# Altium footprint library SMD_Bauteile.PcbLib: 355 footprints (part 3 of 23)
Each footprint in its own frame and in the unit in brackets; x right, y up, seen from the top. Pads: shape width x height; smd on the part's side, far side on the other; paste and mask are expansions set on the pad; w line width, h text height; cw(c..) or ccw(c..) is an arc to the next point about the centre after c.
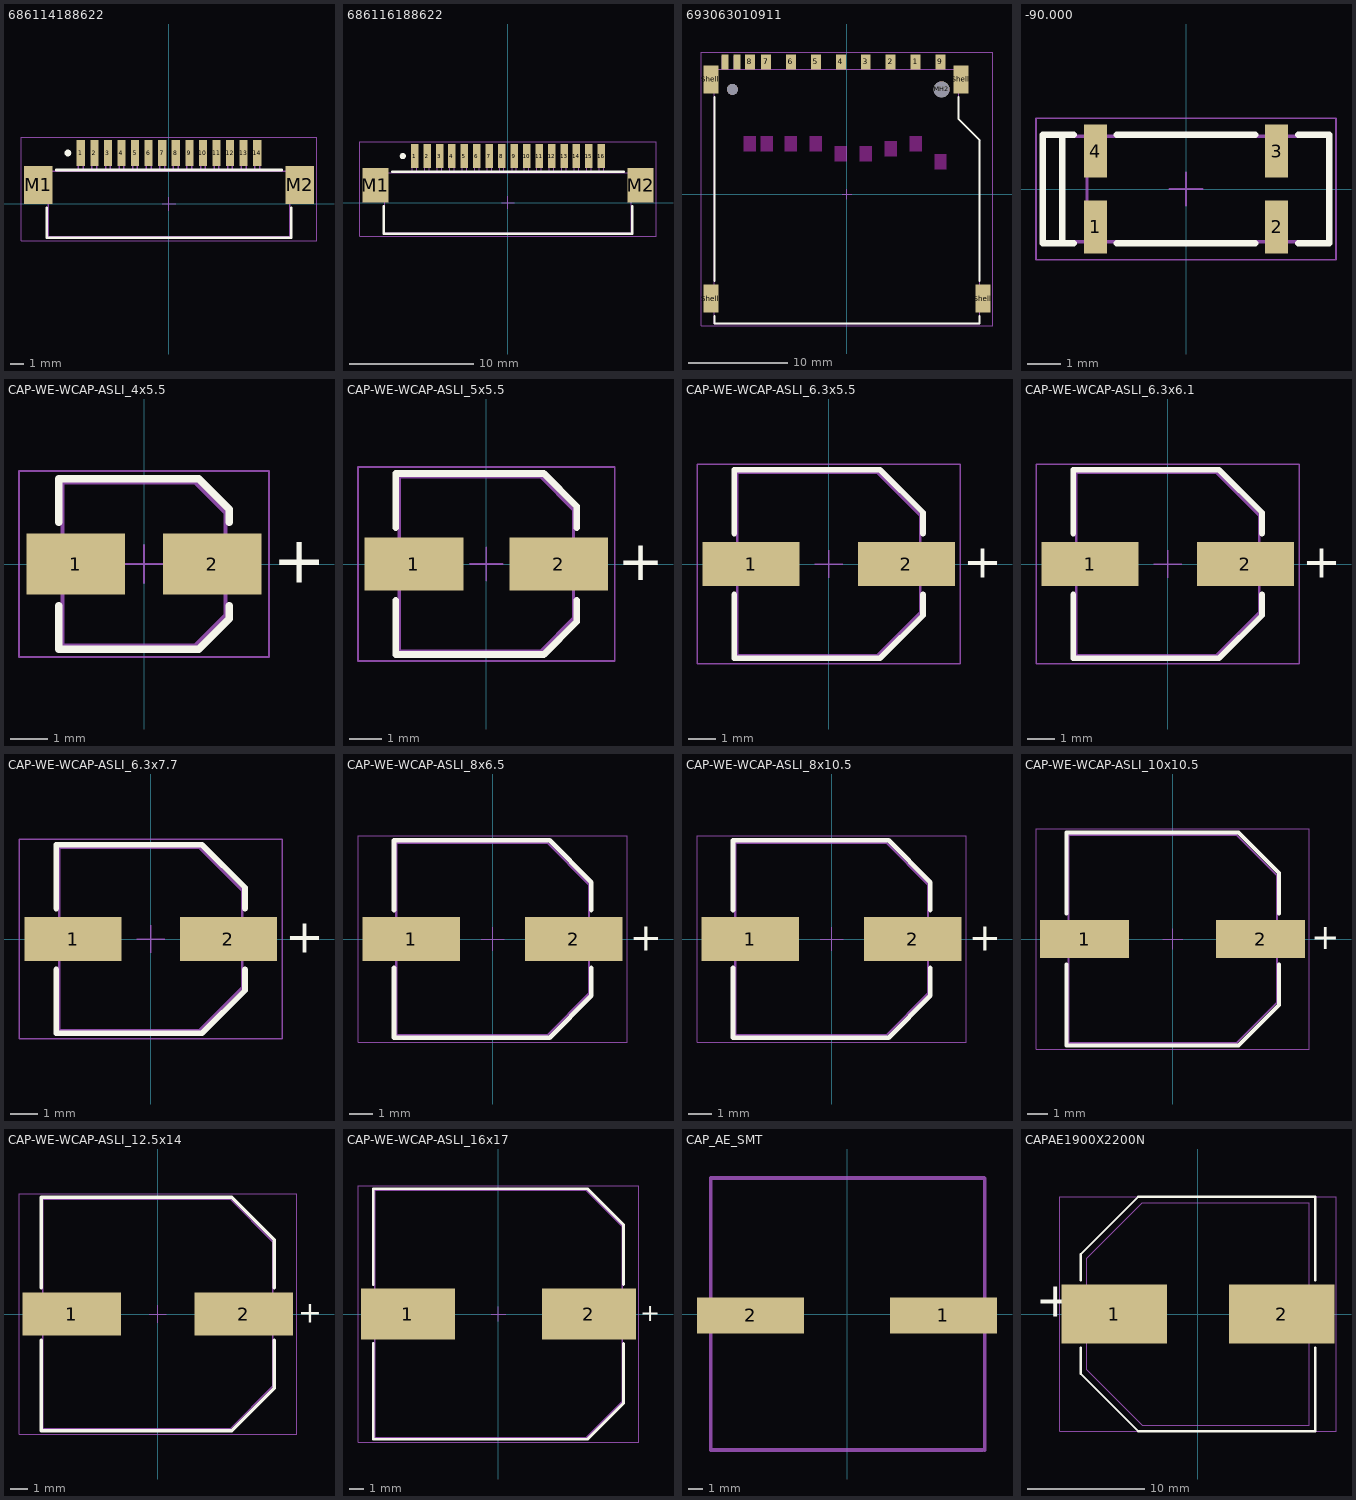
[diagram p2: the footprints below, top view; thin cyan lines are the x and y axes]

## 686114188622 [mm] "LIF Connectors, Horizontal, Top Contact, pitch 1mm, 14p"
height 3.1
pads (16):
  rect 0.6x1.9 smd: 1(-6.5,3.75) 2(-5.5,3.75) 3(-4.5,3.75) 4(-3.5,3.75) 5(-2.5,3.75) 6(-1.5,3.75) 7(-0.5,3.75) 8(0.5,3.75) 9(1.5,3.75) 10(2.5,3.75) 11(3.5,3.75) 12(4.5,3.75) 13(5.5,3.75) 14(6.5,3.75)
  rect 2.1x2.8 smd: M1(-9.65,1.4) M2(9.65,1.4)
Top Overlay:
  circle w0.25: c-7.45,3.75 r0.125
  lines w0.2: -9,-0.3 -9,-2.5 9,-2.5 9,-0.3 ; -8.3,2.5 8.3,2.5
Bottom Designator:
  lines w0.05: -0.5,0 0.5,0 ; 0,-0.5 0,0.5 ; -10.9,-2.7 -10.9,4.9 10.9,4.9 10.9,-2.7 -10.9,-2.7
Top Courtyard (Mech14):
  lines w0.1: -6.675,2.4 -6.675,4.4 -6.325,4.4 -6.325,2.4 ; -5.675,2.4 -5.675,4.4 -5.325,4.4 -5.325,2.4 ; -4.675,2.4 -4.675,4.4 -4.325,4.4 -4.325,2.4 ; -3.675,2.4 -3.675,4.4 -3.325,4.4 -3.325,2.4 ; -2.675,2.4 -2.675,4.4 -2.325,4.4 -2.325,2.4 ; -1.675,2.4 -1.675,4.4 -1.325,4.4 -1.325,2.4 ; -0.675,2.4 -0.675,4.4 -0.325,4.4 -0.325,2.4 ; 0.325,2.4 0.325,4.4 0.675,4.4 0.675,2.4 ; 1.325,2.4 1.325,4.4 1.675,4.4 1.675,2.4 ; 2.325,2.4 2.325,4.4 2.675,4.4 2.675,2.4 ; 3.325,2.4 3.325,4.4 3.675,4.4 3.675,2.4 ; 4.325,2.4 4.325,4.4 4.675,4.4 4.675,2.4 ; 5.325,2.4 5.325,4.4 5.675,4.4 5.675,2.4 ; 6.325,2.4 6.325,4.4 6.675,4.4 6.675,2.4 ; -10.15,0.4 -10.15,2.4 10.15,2.4 10.15,0.4 8.9,0.4 8.9,-2.4 -8.9,-2.4 -8.9,0.4 -10.15,0.4
Mechanical 18:
  lines w0.1: -6.675,2.4 -6.675,4.4 -6.325,4.4 -6.325,2.4 ; -5.675,2.4 -5.675,4.4 -5.325,4.4 -5.325,2.4 ; -4.675,2.4 -4.675,4.4 -4.325,4.4 -4.325,2.4 ; -3.675,2.4 -3.675,4.4 -3.325,4.4 -3.325,2.4 ; -2.675,2.4 -2.675,4.4 -2.325,4.4 -2.325,2.4 ; -1.675,2.4 -1.675,4.4 -1.325,4.4 -1.325,2.4 ; -0.675,2.4 -0.675,4.4 -0.325,4.4 -0.325,2.4 ; 0.325,2.4 0.325,4.4 0.675,4.4 0.675,2.4 ; 1.325,2.4 1.325,4.4 1.675,4.4 1.675,2.4 ; 2.325,2.4 2.325,4.4 2.675,4.4 2.675,2.4 ; 3.325,2.4 3.325,4.4 3.675,4.4 3.675,2.4 ; 4.325,2.4 4.325,4.4 4.675,4.4 4.675,2.4 ; 5.325,2.4 5.325,4.4 5.675,4.4 5.675,2.4 ; 6.325,2.4 6.325,4.4 6.675,4.4 6.675,2.4 ; -10.15,0.4 -8.9,0.4 -8.9,-2.4 8.9,-2.4 8.9,0.4 10.15,0.4 10.15,2.4 -10.15,2.4 -10.15,0.4
Top 3D Body:
  text ".Designator" at -7.498,-0.5 h1.5
3D body "686114188622.stp": height 3.1, standoff -0.01, extent -10.15,-2.4 10.15,4.4

## 686116188622 [mm] "LIF Connectors, Horizontal, Top Contact, pitch 1mm, 16p"
height 3.1
pads (18):
  rect 0.6x1.9 smd: 1(-7.5,3.75) 2(-6.5,3.75) 3(-5.5,3.75) 4(-4.5,3.75) 5(-3.5,3.75) 6(-2.5,3.75) 7(-1.5,3.75) 8(-0.5,3.75) 9(0.5,3.75) 10(1.5,3.75) 11(2.5,3.75) 12(3.5,3.75) 13(4.5,3.75) 14(5.5,3.75) 15(6.5,3.75) 16(7.5,3.75)
  rect 2.1x2.8 smd: M1(-10.65,1.4) M2(10.65,1.4)
Top Overlay:
  circle w0.25: c-8.45,3.75 r0.125
  lines w0.2: -10,-0.3 -10,-2.5 10,-2.5 10,-0.3 ; -9.3,2.5 9.3,2.5
Bottom Designator:
  lines w0.05: -0.5,0 0.5,0 ; 0,-0.5 0,0.5 ; -11.9,-2.7 -11.9,4.9 11.9,4.9 11.9,-2.7 -11.9,-2.7
Top Courtyard (Mech14):
  lines w0.1: -7.675,2.4 -7.675,4.4 -7.325,4.4 -7.325,2.4 ; -6.675,2.4 -6.675,4.4 -6.325,4.4 -6.325,2.4 ; -5.675,2.4 -5.675,4.4 -5.325,4.4 -5.325,2.4 ; -4.675,2.4 -4.675,4.4 -4.325,4.4 -4.325,2.4 ; -3.675,2.4 -3.675,4.4 -3.325,4.4 -3.325,2.4 ; -2.675,2.4 -2.675,4.4 -2.325,4.4 -2.325,2.4 ; -1.675,2.4 -1.675,4.4 -1.325,4.4 -1.325,2.4 ; -0.675,2.4 -0.675,4.4 -0.325,4.4 -0.325,2.4 ; 0.325,2.4 0.325,4.4 0.675,4.4 0.675,2.4 ; 1.325,2.4 1.325,4.4 1.675,4.4 1.675,2.4 ; 2.325,2.4 2.325,4.4 2.675,4.4 2.675,2.4 ; 3.325,2.4 3.325,4.4 3.675,4.4 3.675,2.4 ; 4.325,2.4 4.325,4.4 4.675,4.4 4.675,2.4 ; 5.325,2.4 5.325,4.4 5.675,4.4 5.675,2.4 ; 6.325,2.4 6.325,4.4 6.675,4.4 6.675,2.4 ; 7.325,2.4 7.325,4.4 7.675,4.4 7.675,2.4 ; -11.15,0.4 -11.15,2.4 11.15,2.4 11.15,0.4 9.9,0.4 9.9,-2.4 -9.9,-2.4 -9.9,0.4 -11.15,0.4
Mechanical 18:
  lines w0.1: -7.675,2.4 -7.675,4.4 -7.325,4.4 -7.325,2.4 ; -6.675,2.4 -6.675,4.4 -6.325,4.4 -6.325,2.4 ; -5.675,2.4 -5.675,4.4 -5.325,4.4 -5.325,2.4 ; -4.675,2.4 -4.675,4.4 -4.325,4.4 -4.325,2.4 ; -3.675,2.4 -3.675,4.4 -3.325,4.4 -3.325,2.4 ; -2.675,2.4 -2.675,4.4 -2.325,4.4 -2.325,2.4 ; -1.675,2.4 -1.675,4.4 -1.325,4.4 -1.325,2.4 ; -0.675,2.4 -0.675,4.4 -0.325,4.4 -0.325,2.4 ; 0.325,2.4 0.325,4.4 0.675,4.4 0.675,2.4 ; 1.325,2.4 1.325,4.4 1.675,4.4 1.675,2.4 ; 2.325,2.4 2.325,4.4 2.675,4.4 2.675,2.4 ; 3.325,2.4 3.325,4.4 3.675,4.4 3.675,2.4 ; 4.325,2.4 4.325,4.4 4.675,4.4 4.675,2.4 ; 5.325,2.4 5.325,4.4 5.675,4.4 5.675,2.4 ; 6.325,2.4 6.325,4.4 6.675,4.4 6.675,2.4 ; 7.325,2.4 7.325,4.4 7.675,4.4 7.675,2.4 ; -11.15,0.4 -9.9,0.4 -9.9,-2.4 9.9,-2.4 9.9,0.4 11.15,0.4 11.15,2.4 -11.15,2.4 -11.15,0.4
Top 3D Body:
  text ".Designator" at -7.498,-0.5 h1.5
3D body "686116188622.stp": height 3.1, standoff -0.01, extent -11.15,-2.4 11.15,4.4

## 693063010911 [mm] "SD Card Connector Push & Pull - with Card Detection - 9 Pins"
height 2.6
pads (17):
  rect 1x1.5 smd: 1(6.88,13.3) 2(4.38,13.3) 3(1.88,13.3) 4(-0.62,13.3) 5(-3.12,13.3) 6(-5.62,13.3) 7(-8.12,13.3) 8(-9.75,13.3) 9(9.38,13.3)
  rect 0.7x1.5 smd: 10(-11.05,13.3) 11(-12.25,13.3)
  round 1.1 hole 1.1 unplated: MH1(-11.5,10.55)
  round 1.6 hole 1.6 unplated: MH2(9.5,10.55)
  rect 1.5x2.8 smd: Shell(-13.65,-10.45) Shell(-13.65,11.55) Shell(11.45,11.55) Shell(13.65,-10.45)
Top Layer keep-out:
  region: 8.78,4.05 9.98,4.05 9.98,2.55 8.78,2.55
  region: -10.35,5.85 -9.15,5.85 -9.15,4.35 -10.35,4.35
  region: -8.65,5.85 -7.45,5.85 -7.45,4.35 -8.65,4.35
  region: -6.225,5.85 -5.025,5.85 -5.025,4.35 -6.225,4.35
  region: -3.725,5.85 -2.525,5.85 -2.525,4.35 -3.725,4.35
  region: 6.275,5.85 7.475,5.85 7.475,4.35 6.275,4.35
  region: 3.775,5.35 4.975,5.35 4.975,3.85 3.775,3.85
  region: 1.275,4.85 2.475,4.85 2.475,3.35 1.275,3.35
  region: -1.225,4.85 -0.025,4.85 -0.025,3.35 -1.225,3.35
Top Overlay:
  lines w0.2: -13.3,-12.2 -13.3,-12.95 13.3,-12.95 13.3,-12.2 ; -13.3,-8.7 -13.3,9.8 ; 11.2,9.8 11.2,7.55 13.3,5.45 13.3,-8.7
Bottom Designator:
  lines w0.05: -14.6,-13.15 14.6,-13.15 14.6,14.25 -14.6,14.25 -14.6,-13.15
Bottom 3D Body:
  lines w0.05: -0.5,0 0.5,0 ; 0,-0.5 0,0.5
Top Courtyard (Mech14):
  lines w0.1: -13.3,-11.45 -14,-11.45 -14,-9.45 -13.3,-9.45 ; -13.3,10.55 -14,10.55 -14,12.55 -13.3,12.55 ; -12.525,12.55 -12.525,13.85 -11.975,13.85 -11.975,12.55 ; -11.325,12.55 -11.325,13.85 -10.775,13.85 -10.775,12.55 ; -10.025,12.55 -10.025,13.85 -9.475,13.85 -9.475,12.55 ; -8.395,12.55 -8.395,13.85 -7.845,13.85 -7.845,12.55 ; -5.895,12.55 -5.895,13.85 -5.345,13.85 -5.345,12.55 ; -3.395,12.55 -3.395,13.85 -2.845,13.85 -2.845,12.55 ; -0.895,12.55 -0.895,13.85 -0.345,13.85 -0.345,12.55 ; 1.605,12.55 1.605,13.85 2.155,13.85 2.155,12.55 ; 4.105,12.55 4.105,13.85 4.655,13.85 4.655,12.55 ; 6.605,12.55 6.605,13.85 7.155,13.85 7.155,12.55 ; 9.105,12.55 9.105,13.85 9.655,13.85 9.655,12.55 ; 11.2,10.55 11.9,10.55 11.9,12.55 11.2,12.55 ; 13.3,-11.45 14,-11.45 14,-9.45 13.3,-9.45 ; -13.3,12.55 11.2,12.55 ; -13.3,12.55 -13.3,-12.95 13.3,-12.95 13.3,5.45 11.2,7.55 11.2,12.55
Top 3D Body:
  text ".Designator" at -7.498,-0.5 h1.5
3D body "693063010911.stp": height 3.27, standoff -0.67, extent -14,-12.95 14,13.85

## -90.000 [mm] "Quartz Crystal, size 85SMX, body 8.7x3.2mm"
height 2.5
pads (4):
  rect 0.7x1.6 smd: 1(-2.75,-1.15) 2(2.75,-1.15) 3(2.75,1.15) 4(-2.75,1.15)
Top Overlay:
  lines w0.2: -3.75,-1.6 -3.75,1.6 ; -3.4,-1.65 -4.35,-1.65 -4.35,1.65 -3.4,1.65 ; -2.1,-1.65 2.1,-1.65 ; -2.1,1.65 2.1,1.65 ; 3.4,-1.65 4.35,-1.65 4.35,1.65 3.4,1.65
Dimensions:
  lines w0.1: -3,-1.6 -3,1.6 ; -4.35,-1.6 4.35,-1.6 4.35,1.6 -4.35,1.6 -4.35,-1.6
Mech Misc 1:
  lines w0.1: -4.35,-1.6 -4.35,1.6 4.35,1.6 4.35,-1.6 -4.35,-1.6
Mech 15:
  lines w0.05: -0.5,0 0.5,0 ; 0,-0.5 0,0.5 ; -4.55,-2.15 4.55,-2.15 4.55,2.15 -4.55,2.15 -4.55,-2.15
3D body "FrqXTAL_85SMX.stp": height 2.45, standoff 0, extent -3.9,-1.849 3.9,1.849

## CAP-WE-WCAP-ASLI_4x5.5 [mm] "Aluminium Electrolytic V-Chip SMT Capacitors, 4x5.5mm"
height 5.5
pads (2):
  rect 2.6x1.6 smd: 1(-1.8,0) 2(1.8,0)
Top Overlay:
  lines w0.2: -2.25,-1.1 -2.25,-2.25 1.45,-2.25 2.25,-1.45 2.25,-1.1 ; -2.25,1.1 -2.25,2.25 1.45,2.25 2.25,1.45 2.25,1.1
  text "+" at 3.4,-0.5 h1.22
Mech Misc 1:
  lines w0.1: -2.15,-2.15 1.35,-2.15 2.15,-1.35 2.15,1.35 1.35,2.15 -2.15,2.15 -2.15,-2.15
Mech 15:
  lines w0.05: -0.5,0 0.5,0 ; 0,-0.5 0,0.5 ; -3.3,-2.45 -3.3,2.45 3.3,2.45 3.3,-2.45 -3.3,-2.45
3D body "4x5.5x1.stp": height 5.5, standoff 0, extent -2.5,-2.15 2.5,2.15

## CAP-WE-WCAP-ASLI_5x5.5 [mm] "Aluminium Electrolytic V-Chip SMT Capacitors, 5x5.5mm"
height 5.5
pads (2):
  rect 3x1.6 smd: 1(-2.2,0) 2(2.2,0)
Top Overlay:
  lines w0.2: -2.75,-1.1 -2.75,-2.75 1.75,-2.75 2.75,-1.75 2.75,-1.1 ; -2.75,1.1 -2.75,2.75 1.75,2.75 2.75,1.75 2.75,1.1
  text "+" at 4,-0.5 h1.22
Mech Misc 1:
  lines w0.1: -2.65,-2.65 -2.65,2.65 1.65,2.65 2.65,1.65 2.65,-1.65 1.65,-2.65 -2.65,-2.65
Mech 15:
  lines w0.05: -0.5,0 0.5,0 ; 0,-0.5 0,0.5 ; -3.9,-2.95 3.9,-2.95 3.9,2.95 -3.9,2.95 -3.9,-2.95
3D body "5x5.5x1.4.stp": height 5.5, standoff 0, extent -3,-2.65 3,2.65

## CAP-WE-WCAP-ASLI_6.3x5.5 [mm] "Aluminium Electrolytic V-Chip SMT Capacitors, 6.3x5.5mm"
height 5.5
pads (2):
  rect 3.5x1.6 smd: 1(-2.8,0) 2(2.8,0)
Top Overlay:
  lines w0.2: -3.4,-1.1 -3.4,-3.4 1.85,-3.4 3.4,-1.85 3.4,-1.1 ; -3.4,1.1 -3.4,3.4 1.85,3.4 3.4,1.85 3.4,1.1
  text "+" at 4.85,-0.5 h1.22
Mech Misc 1:
  lines w0.1: -3.3,-3.3 -3.3,3.3 1.75,3.3 3.3,1.75 3.3,-1.75 1.75,-3.3 -3.3,-3.3
Mech 15:
  lines w0.05: -0.5,0 0.5,0 ; 0,-0.5 0,0.5 ; -4.75,-3.6 4.75,-3.6 4.75,3.6 -4.75,3.6 -4.75,-3.6
3D body "6.3x5.5x2.2.stp": height 5.5, standoff 0, extent -3.65,-3.3 3.65,3.3

## CAP-WE-WCAP-ASLI_6.3x6.1 [mm] "Aluminium Electrolytic V-Chip SMT Capacitors, 6.3x6.1mm"
height 6.1
pads (2):
  rect 3.5x1.6 smd: 1(-2.8,0) 2(2.8,0)
Top Overlay:
  lines w0.2: -3.4,-1.1 -3.4,-3.4 1.85,-3.4 3.4,-1.85 3.4,-1.1 ; -3.4,1.1 -3.4,3.4 1.85,3.4 3.4,1.85 3.4,1.1
  text "+" at 4.85,-0.5 h1.22
Mech Misc 1:
  lines w0.1: -3.3,-3.3 -3.3,3.3 1.75,3.3 3.3,1.75 3.3,-1.75 1.75,-3.3 -3.3,-3.3
Mech 15:
  lines w0.05: -0.5,0 0.5,0 ; 0,-0.5 0,0.5 ; -4.75,-3.6 4.75,-3.6 4.75,3.6 -4.75,3.6 -4.75,-3.6
3D body "6.3x6.1x2.2.stp": height 6.1, standoff 0, extent -3.65,-3.3 3.65,3.3

## CAP-WE-WCAP-ASLI_6.3x7.7 [mm] "Aluminium Electrolytic V-Chip SMT Capacitors, 6.3x7.7mm"
height 7.7
pads (2):
  rect 3.5x1.6 smd: 1(-2.8,0) 2(2.8,0)
Top Overlay:
  lines w0.2: -3.4,-1.1 -3.4,-3.4 1.85,-3.4 3.4,-1.85 3.4,-1.1 ; -3.4,1.1 -3.4,3.4 1.85,3.4 3.4,1.85 3.4,1.1
  text "+" at 4.85,-0.5 h1.22
Mech Misc 1:
  lines w0.1: -3.3,-3.3 1.75,-3.3 3.3,-1.75 3.3,1.75 1.75,3.3 -3.3,3.3 -3.3,-3.3
Mech 15:
  lines w0.05: -0.5,0 0.5,0 ; 0,-0.5 0,0.5 ; -4.75,-3.6 -4.75,3.6 4.75,3.6 4.75,-3.6 -4.75,-3.6
3D body "6.3x7.7x2.2.stp": height 7.7, standoff 0, extent -3.65,-3.3 3.65,3.3

## CAP-WE-WCAP-ASLI_8x6.5 [mm] "Aluminium Electrolytic V-Chip SMT Capacitors, 8x6.5mm"
height 6.5
pads (2):
  rect 4.2x1.9 smd: 1(-3.5,0) 2(3.5,0)
Top Overlay:
  lines w0.2: -4.25,-1.25 -4.25,-4.25 2.45,-4.25 4.25,-2.45 4.25,-1.25 ; -4.25,1.25 -4.25,4.25 2.45,4.25 4.25,2.45 4.25,1.25
  text "+" at 5.9,-0.5 h1.22
Mech Misc 1:
  lines w0.1: -4.15,-4.15 2.35,-4.15 4.15,-2.35 4.15,2.35 2.35,4.15 -4.15,4.15 -4.15,-4.15
Mech 15:
  lines w0.05: -0.5,0 0.5,0 ; 0,-0.5 0,0.5 ; -5.8,-4.45 -5.8,4.45 5.8,4.45 5.8,-4.45 -5.8,-4.45
3D body "8x6.5x2.3.stp": height 6.45, standoff -0.05, extent -4.5,-4.15 4.5,4.15

## CAP-WE-WCAP-ASLI_8x10.5 [mm] "Aluminium Electrolytic V-Chip SMT Capacitors, 8x10.5mm"
height 10.5
pads (2):
  rect 4.2x1.9 smd: 1(-3.5,0) 2(3.5,0)
Top Overlay:
  lines w0.2: -4.25,-1.25 -4.25,-4.25 2.45,-4.25 4.25,-2.45 4.25,-1.25 ; -4.25,1.25 -4.25,4.25 2.45,4.25 4.25,2.45 4.25,1.25
  text "+" at 5.9,-0.5 h1.22
Mech Misc 1:
  lines w0.1: -4.15,-4.15 2.35,-4.15 4.15,-2.35 4.15,2.35 2.35,4.15 -4.15,4.15 -4.15,-4.15
Mech 15:
  lines w0.05: -0.5,0 0.5,0 ; 0,-0.5 0,0.5 ; -5.8,-4.45 -5.8,4.45 5.8,4.45 5.8,-4.45 -5.8,-4.45
3D body "8x10.5x3.1.stp": height 10.5, standoff 0, extent -4.5,-4.15 4.5,4.15

## CAP-WE-WCAP-ASLI_10x10.5 [mm] "Aluminium Electrolytic V-Chip SMT Capacitors, 10x10.5mm"
height 10.5
pads (2):
  rect 4.4x1.9 smd: 1(-4.35,0) 2(4.35,0)
Top Overlay:
  lines w0.2: -5.25,-1.25 -5.25,-5.25 3.25,-5.25 5.25,-3.25 5.25,-1.25 ; -5.25,1.25 -5.25,5.25 3.25,5.25 5.25,3.25 5.25,1.25
  text "+" at 6.85,-0.5 h1.22
Mech Misc 1:
  lines w0.1: -5.15,-5.15 -5.15,5.15 3.15,5.15 5.15,3.15 5.15,-3.15 3.15,-5.15 -5.15,-5.15
Mech 15:
  lines w0.05: -0.5,0 0.5,0 ; 0,-0.5 0,0.5 ; -6.75,-5.45 6.75,-5.45 6.75,5.45 -6.75,5.45 -6.75,-5.45
3D body "10x10.5x4.5.stp": height 10.5, standoff 0, extent -5.5,-5.15 5.5,5.15

## CAP-WE-WCAP-ASLI_12.5x14 [mm] "Aluminium Electrolytic V-Chip SMT Capacitors, 12.5x14mm"
height 14
pads (2):
  rect 5.8x2.5 smd: 1(-5.05,0) 2(5.05,0)
Top Overlay:
  lines w0.2: -6.85,-1.55 -6.85,-6.85 4.35,-6.85 6.85,-4.35 6.85,-1.55 ; -6.85,1.55 -6.85,6.85 4.35,6.85 6.85,4.35 6.85,1.55
  text "+" at 8.25,-0.5 h1.22
Mech Misc 1:
  lines w0.1: -6.75,-6.75 -6.75,6.75 4.25,6.75 6.75,4.25 6.75,-4.25 4.25,-6.75 -6.75,-6.75
Mech 15:
  lines w0.05: -0.5,0 0.5,0 ; 0,-0.5 0,0.5 ; -8.15,-7.05 8.15,-7.05 8.15,7.05 -8.15,7.05 -8.15,-7.05
3D body "12.5x14x4.5.stp": height 14, standoff 0, extent -7.1,-6.725 7.1,6.725

## CAP-WE-WCAP-ASLI_16x17 [mm] "Aluminium Electrolytic V-Chip SMT Capacitors, 16x17mm"
height 17
pads (2):
  rect 6.5x3.5 smd: 1(-6.25,0) 2(6.25,0)
Top Overlay:
  lines w0.2: -8.65,-2.05 -8.65,-8.65 6.15,-8.65 8.65,-6.15 8.65,-2.05 ; -8.65,2.05 -8.65,8.65 6.15,8.65 8.65,6.15 8.65,2.05
  text "+" at 9.8,-0.5 h1.22
Mech Misc 1:
  lines w0.1: -8.55,-8.55 6.05,-8.55 8.55,-6.05 8.55,6.05 6.05,8.55 -8.55,8.55 -8.55,-8.55
Mech 15:
  lines w0.05: -0.5,0 0.5,0 ; 0,-0.5 0,0.5 ; -9.7,-8.85 -9.7,8.85 9.7,8.85 9.7,-8.85 -9.7,-8.85
3D body "16x17x7_new.stp": height 17, standoff 0, extent -9.15,-8.5 9.15,8.5

## CAP_AE_SMT [mm] "Electrolytic V-Chip SMT Capacitors, 19x19mm; EEEFK1E332AM"
height 16
pads (2):
  rect 7.5x2.5 smd: 1(6.75,-0.099) 2(-6.75,-0.099)
Mech Misc 1:
  lines w0.254: 9.484,-9.516 -9.525,-9.516 -9.525,9.516 9.611,9.516 ; 9.643,-9.516 9.643,9.484
3D body: height 16.5, standoff 0, extent -9.5,-9.497 9.5,9.497

## CAPAE1900X2200N [mm]
pads (2):
  rect 9x5 smd paste+0: 1(-7.15,0) 2(7.15,0)
Top Overlay:
  lines w0.2: -10,-2.852 -10,-5.1 -5.1,-10 9.5,-10 10,-10 10,-9.5 10,-5.152 10,-2.852 ; -10,2.852 -10,5.1 -5.1,10 9.5,10 10,10 10,9.5 10,5.5 10,5.152 10,2.852
  text "+" at -13.821,-1.212 h5
Mech Misc 1:
  lines w0.1: -9.5,-4.75 -9.5,4.75 -4.75,9.5 9.5,9.5 9.5,-9.5 -4.75,-9.5 -9.5,-4.75
Mech 15:
  lines w0.05: -11.775,-10 11.775,-10 11.775,10 -11.775,10 -11.775,-10
3D body "MAL224699814E3.stp": height 22, standoff 0, extent -10.5,-9.5 10.5,9.5